# Altium footprint library Apalis Evaluation Board.PcbLib: 166 footprints (part 11 of 11)
Each footprint in its own frame and in the unit in brackets; x right, y up, seen from the top. Pads: shape width x height; smd on the part's side, far side on the other; paste and mask are expansions set on the pad; w line width, h text height; cw(c..) or ccw(c..) is an arc to the next point about the centre after c.
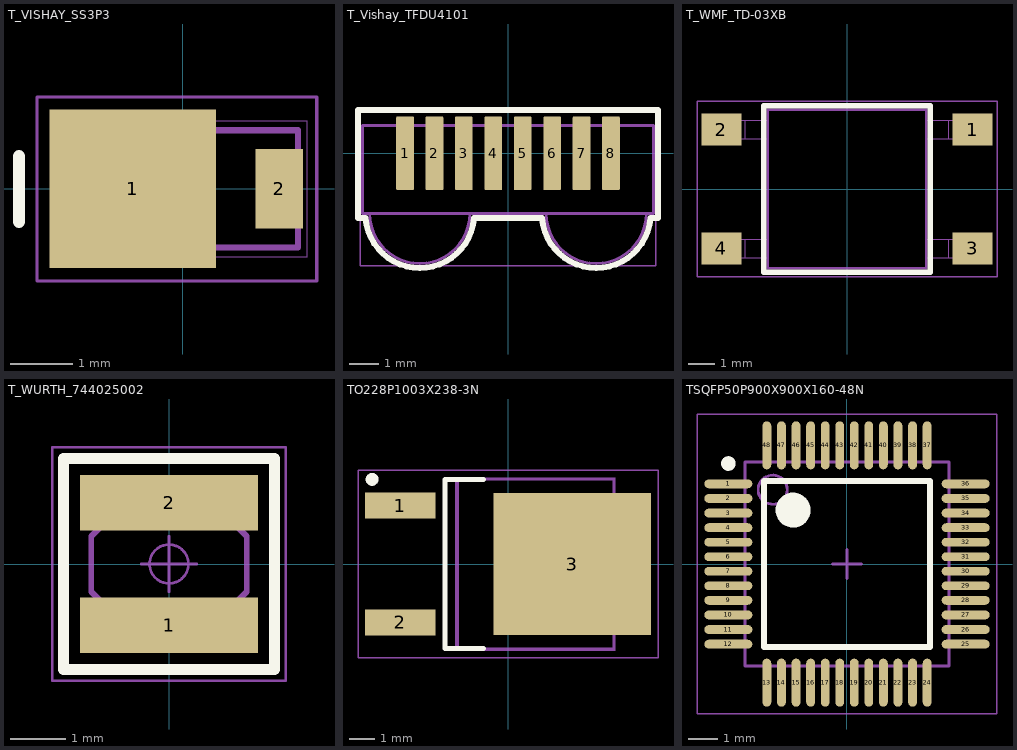
[diagram p10: the footprints below, top view; thin cyan lines are the x and y axes]

## T_VISHAY_SS3P3 [mm] "Schottky Barrier Rectifiers. 2-Leads, Body 3.7x1.88mm"
height 1.15
pads (2):
  rect 2.67x2.54 smd: 1(-0.8,0)
  rect 0.762x1.27 smd: 2(1.551,0)
Top Overlay:
  lines w0.2: -2.628,-0.529 -2.628,0.521
Mechanical 1:
  lines w0.05: -2.339,-1.482 -2.339,1.476 2.15,1.476 2.15,-1.482 -2.339,-1.482
Mechanical 2:
  lines w0.001: -2,-1.09 -2,1.09 2,1.09 2,-1.09 -2,-1.09
Mechanical 3:
  rectangle: -1.9,-0.94 -1.443,0.94
  lines w0.1: -1.85,-0.94 1.85,-0.94 1.85,0.94 -1.85,0.94 ; -1.7,-0.9 -1.7,0.9

## T_Vishay_TFDU4101 [mm] "Infrared Transceiver Module"
height 4
pads (8):
  rrect12% 0.6x2.5 smd: 1(-3.5,0) 2(-2.5,0) 3(-1.5,0) 4(-0.5,0) 5(0.5,0) 6(1.5,0) 7(2.5,0) 8(3.5,0)
Top Overlay:
  lines w0.2: -4.85,-2.2 -5.1,-2.2 -5.1,1.475 5.1,1.475 5.1,-2.2 4.85,-2.2 ; -4.844,-2.2 ccw(c-3,-2.05) -1.156,-2.2 ; -1.15,-2.2 1.15,-2.2 ; 1.156,-2.2 ccw(c3,-2.05) 4.844,-2.2
Mechanical 1:
  lines w0.05: -5.025,-3.825 5.025,-3.825 5.025,1.4 -5.025,1.4 -5.025,-3.825
Mechanical 2:
  lines w0.001: -4.7,-2.05 ccw(c-3,-2.05) -1.3,-2.05 ; 1.3,-2.05 ccw(c3,-2.05) 4.7,-2.05 ; -4.95,-2.05 -4.95,0.95 4.95,0.95 4.95,-2.05 -4.95,-2.05
Mechanical 3:
  lines w0.1: -4.7,-2.05 ccw(c-3,-2.05) -1.3,-2.05 ; 1.3,-2.05 ccw(c3,-2.05) 4.7,-2.05 ; -4.95,-2.05 4.95,-2.05 4.95,0.95 -4.95,0.95 -4.95,-2.05
3D body: height 4.32, standoff 0.02, extent -4.956,-3.941 4.95,1.367

## T_WMF_TD-03XB [mm] "Push Button"
height 7.8
pads (4):
  rect 1.5x1.2 smd: 1(4.75,2.25) 2(-4.75,2.25) 3(4.75,-2.25) 4(-4.75,-2.25)
Top Overlay:
  lines w0.2: -3.15,-3.15 -3.15,3.15 3.15,3.15 3.15,-3.15 -3.15,-3.15
Mechanical 1:
  lines w0.05: -5.675,-3.321 -5.675,3.321 5.675,3.321 5.675,-3.321 -5.675,-3.321
Mechanical 2:
  lines w0.001: -4.05,-2.6 -4.05,-1.9 ; -4.05,1.9 -4.05,2.6 ; -3.85,-2.6 -3.85,-1.9 ; -3.85,1.9 -3.85,2.6 ; -3,-2.6 -5.15,-2.6 -5.15,-1.9 -3,-1.9 ; -3,1.9 -5.15,1.9 -5.15,2.6 -3,2.6 ; 3,-2.6 5.15,-2.6 5.15,-1.9 3,-1.9 ; 3,1.9 5.15,1.9 5.15,2.6 3,2.6 ; 3.85,-2.6 3.85,-1.9 ; 3.85,1.9 3.85,2.6 ; 4.05,-2.6 4.05,-1.9 ; 4.05,1.9 4.05,2.6 ; -3,-3 -3,3 3,3 3,-3 -3,-3
Mechanical 3:
  lines w0.1: -3,-3 -3,3 3,3 3,-3 -3,-3
3D body: height 1, standoff 0.8, extent 3,1.9 3.85,2.6
3D body: height 1, standoff 0.8, extent 3,-2.6 3.85,-1.9
3D body: height 1, standoff 0.8, extent -3.85,-2.6 -3,-1.9
3D body: height 1, standoff 0.8, extent -3.85,1.9 -3,2.6
3D body: height 1, standoff 0, extent -4.05,1.9 -3.85,2.6
3D body: height 1, standoff 0, extent -4.05,-2.6 -3.85,-1.9
3D body: height 1, standoff 0, extent 3.85,-2.6 4.05,-1.9
3D body: height 1, standoff 0, extent 3.85,1.9 4.05,2.6
3D body: height 0.2, standoff 0, extent 4.05,1.9 5.15,2.6
3D body: height 0.2, standoff 0, extent 4.05,-2.6 5.15,-1.9
3D body: height 0.2, standoff 0, extent -5.15,-2.6 -4.05,-1.9
3D body: height 0.2, standoff 0, extent -5.15,1.9 -4.05,2.6
3D body: height 3.7, standoff 3.5, extent 1.754,-2.749 2.75,-1.751
3D body: height 3.7, standoff 3.5, extent -2.746,-2.749 -1.75,-1.751
3D body: height 3.7, standoff 3.5, extent -2.746,1.751 -1.75,2.749
3D body: height 3.7, standoff 3.5, extent 1.754,1.751 2.75,2.749
3D body: height 3.49, standoff 0, extent -3,-3 3,3
3D body: height 7.8, standoff 3.5, extent -1.736,-1.747 1.75,1.747
3D body: height 3.5, standoff 3.49, extent -3,-3 3,3

## T_WURTH_744025002 [mm] "POWER-CHOKE"
height 2.8
pads (2):
  rect 3.2x1 smd: 1(0,-1.1) 2(0,1.1)
Top Overlay:
  lines w0.2: -1.9,-1.9 -1.9,1.9 1.9,1.9 1.9,-1.9 -1.9,-1.9
Mechanical 1:
  lines w0.05: -2.1,-2.1 2.1,-2.1 2.1,2.1 -2.1,2.1 -2.1,-2.1
Mechanical 2:
  lines w0.01: -1.4,-0.5 -0.5,-1.4 0.5,-1.4 1.4,-0.5 1.4,0.5 0.5,1.4 -0.5,1.4 -1.4,0.5 -1.4,-0.5
Mechanical 3:
  circle w0.05: c0,0 r0.35
  lines w0.05: -0.5,0 0.5,0 ; 0,-0.5 0,0.5
  lines w0.1: -1.4,-0.5 -0.5,-1.4 0.5,-1.4 1.4,-0.5 1.4,0.5 0.5,1.4 -0.5,1.4 -1.4,0.5 -1.4,-0.5
3D body: height 2.8, standoff 0, extent -1.4,-1.4 1.4,1.4
3D body: height 2.81, standoff 0, extent -0.996,-1 0.996,0.996

## TO228P1003X238-3N [mm]
pads (3):
  rect 2.75x1 smd: 1(-4.2,2.28) 2(-4.2,-2.28)
  rect 6.15x5.55 smd: 3(2.5,0)
Top Overlay:
  circle w0.25: c-5.3,3.3 r0.125
  lines w0.2: -0.95,-3.3 -2.45,-3.3 -2.45,3.3 -0.95,3.3
Top Paste:
  region: 2.86,0.36 4.86,0.36 4.86,2.06 2.86,2.06
  region: 0.14,0.36 2.14,0.36 2.14,2.06 0.14,2.06
  region: 2.86,-2.06 4.86,-2.06 4.86,-0.36 2.86,-0.36
  region: 0.14,-2.06 2.14,-2.06 2.14,-0.36 0.14,-0.36
Mechanical 1:
  circle w0.05: c0,0 r0.35
  lines w0.05: -0.5,0 0.5,0 ; 0,-0.5 0,0.5 ; -5.85,-3.65 -5.85,3.65 5.85,3.65 5.85,-3.65 -5.85,-3.65
Mechanical 2:
  lines w0.001: -2.032,-3.365 -2.032,3.365 4.188,3.365 4.188,-3.365 -2.032,-3.365
Mechanical 3:
  lines w0.1: 4.125,-2.668 4.419,-2.668 5.015,-2.006 5.015,2.006 4.419,2.668 4.125,2.668 ; -1.97,-3.302 -1.97,3.302 4.125,3.302 4.125,-3.302 -1.97,-3.302

## TSQFP50P900X900X160-48N [mm]
pads (48):
  oval 1.65x0.3 smd: 1(-4.075,2.75) 2(-4.075,2.25) 3(-4.075,1.75) 4(-4.075,1.25) 5(-4.075,0.75) 6(-4.075,0.25) 7(-4.075,-0.25) 8(-4.075,-0.75) 9(-4.075,-1.25) 10(-4.075,-1.75) 11(-4.075,-2.25) 12(-4.075,-2.75) 25(4.075,-2.75) 26(4.075,-2.25) 27(4.075,-1.75) 28(4.075,-1.25) 29(4.075,-0.75) 30(4.075,-0.25) 31(4.075,0.25) 32(4.075,0.75) 33(4.075,1.25) 34(4.075,1.75) 35(4.075,2.25) 36(4.075,2.75)
  oval 0.3x1.65 smd: 13(-2.75,-4.075) 14(-2.25,-4.075) 15(-1.75,-4.075) 16(-1.25,-4.075) 17(-0.75,-4.075) 18(-0.25,-4.075) 19(0.25,-4.075) 20(0.75,-4.075) 21(1.25,-4.075) 22(1.75,-4.075) 23(2.25,-4.075) 24(2.75,-4.075) 37(2.75,4.075) 38(2.25,4.075) 39(1.75,4.075) 40(1.25,4.075) 41(0.75,4.075) 42(0.25,4.075) 43(-0.25,4.075) 44(-0.75,4.075) 45(-1.25,4.075) 46(-1.75,4.075) 47(-2.25,4.075) 48(-2.75,4.075)
Top Overlay:
  circle w0.25: c-4.075,3.45 r0.125
  circle w0.6: c-1.85,1.85 r0.3
  lines w0.2: -2.85,-2.85 -2.85,2.85 2.85,2.85 2.85,-2.85 -2.85,-2.85
Mechanical 1:
  lines w0.05: -5.15,-5.15 -5.15,5.15 5.15,5.15 5.15,-5.15 -5.15,-5.15
Mechanical 2:
  lines w0.01: -3.5,-3.5 3.5,-3.5 3.5,3.5 -3.5,3.5 -3.5,-3.5
Mechanical 3:
  circle w0.1: c-2.55,2.55 r0.5
  lines w0.1: -0.5,0 0.5,0 ; 0,-0.5 0,0.5 ; -3.5,-3.5 3.5,-3.5 3.5,3.5 -3.5,3.5 -3.5,-3.5
3D body: height 1.6, standoff 0.25, extent -3.5,-3.5 3.5,3.5